# Altium footprint library PcbLib.PcbLib: 37 footprints (part 3 of 3)
Each footprint in its own frame and in the unit in brackets; x right, y up, seen from the top. Pads: shape width x height; smd on the part's side, far side on the other; paste and mask are expansions set on the pad; w line width, h text height; cw(c..) or ccw(c..) is an arc to the next point about the centre after c.
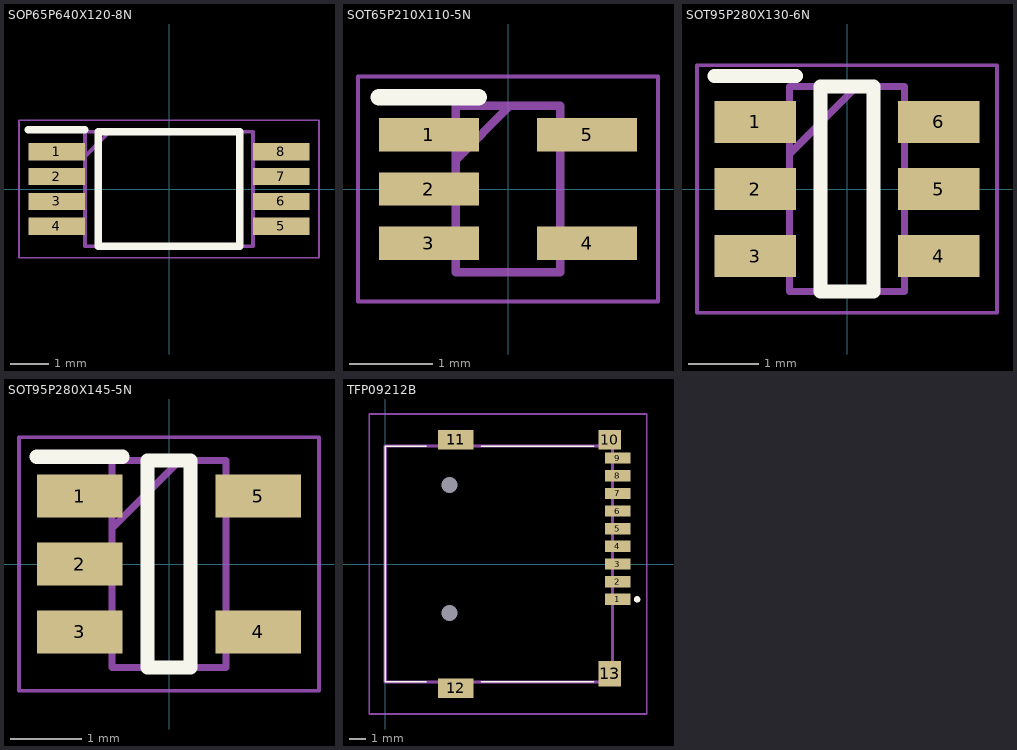
[diagram p2: the footprints below, top view; thin cyan lines are the x and y axes]

## SOP65P640X120-8N [mm]
pads (8):
  rect 1.475x0.45 smd: 1(-2.938,0.975) 2(-2.938,0.325) 3(-2.938,-0.325) 4(-2.938,-0.975) 5(2.938,-0.975) 6(2.938,-0.325) 7(2.938,0.325) 8(2.938,0.975)
Top Overlay:
  lines w0.2: -3.675,1.55 -2.2,1.55 ; -1.85,-1.5 -1.85,1.5 1.85,1.5 1.85,-1.5 -1.85,-1.5
Mechanical 13:
  lines w0.1: -2.2,0.85 -1.55,1.5 ; -2.2,-1.5 -2.2,1.5 2.2,1.5 2.2,-1.5 -2.2,-1.5
Mechanical 15:
  lines w0.05: -3.925,-1.8 -3.925,1.8 3.925,1.8 3.925,-1.8 -3.925,-1.8
3D body "24AA32A-I_ST.stp": height 1.2, standoff 0, extent -3.2,-1.5 3.2,1.5

## SOT65P210X110-5N [mm]
pads (5):
  rect 1.2x0.4 smd: 1(-0.95,0.65) 2(-0.95,0) 3(-0.95,-0.65) 4(0.95,-0.65) 5(0.95,0.65)
Top Overlay:
  lines w0.2: -1.55,1.1 -0.35,1.1
Mechanical 13:
  lines w0.1: -0.625,0.35 0.025,1 ; -0.625,-1 -0.625,1 0.625,1 0.625,-1 -0.625,-1
Mechanical 15:
  lines w0.05: -1.8,-1.35 -1.8,1.35 1.8,1.35 1.8,-1.35 -1.8,-1.35
3D body "ESDALC6V1W5.stp": height 1.1, standoff 0, extent -1.05,-1 1.05,1

## SOT95P280X130-6N [mm]
pads (6):
  rect 1.15x0.6 smd: 1(-1.3,0.95) 2(-1.3,0) 3(-1.3,-0.95) 4(1.3,-0.95) 5(1.3,0) 6(1.3,0.95)
Top Overlay:
  lines w0.2: -1.875,1.6 -0.725,1.6 ; -0.375,-1.45 0.375,-1.45 0.375,1.45 -0.375,1.45 -0.375,-1.45
Mechanical 13:
  lines w0.1: -0.812,0.5 0.138,1.45 ; -0.812,-1.45 0.812,-1.45 0.812,1.45 -0.812,1.45 -0.812,-1.45
Mechanical 15:
  lines w0.05: -2.125,-1.75 2.125,-1.75 2.125,1.75 -2.125,1.75 -2.125,-1.75
3D body "IRLMS6802TRPBF.stp": height 1.3, standoff 0, extent -1.4,-1.45 1.4,1.45

## SOT95P280X145-5N [mm]
pads (5):
  rect 1.2x0.6 smd: 1(-1.25,0.95) 2(-1.25,0) 3(-1.25,-0.95) 4(1.25,-0.95) 5(1.25,0.95)
Top Overlay:
  lines w0.2: -1.85,1.5 -0.65,1.5 ; -0.3,-1.45 0.3,-1.45 0.3,1.45 -0.3,1.45 -0.3,-1.45
Mechanical 13:
  lines w0.1: -0.8,0.5 0.15,1.45 ; -0.8,-1.45 0.8,-1.45 0.8,1.45 -0.8,1.45 -0.8,-1.45
Mechanical 15:
  lines w0.05: -2.1,-1.775 2.1,-1.775 2.1,1.775 -2.1,1.775 -2.1,-1.775
3D body "LP2981IM5X-5.0.stp": height 1.2, standoff 0, extent -1.4,-1.45 1.4,1.45

## TFP09212B [mm]
pads (15):
  rect 1.6x0.7 smd: 1(14.5,-2.2) 2(14.5,-1.1) 3(14.5,0) 4(14.5,1.1) 5(14.5,2.2) 6(14.5,3.3) 7(14.5,4.4) 8(14.5,5.5) 9(14.5,6.6)
  rect 1.4x1.2 smd: 10(14,7.75)
  rect 2.2x1.2 smd: 11(4.4,7.75) 12(4.4,-7.75)
  rect 1.4x1.6 smd: 13(14,-6.85)
  round 0.5 hole 1 unplated: MH1(4,-3.05) MH2(4,4.93)
Top Overlay:
  lines w0.1: 2.54,-7.35 0,-7.35 0,7.35 2.54,7.35 ; 6,-7.35 13,-7.35 ; 6,7.35 13,7.35
  lines w0.2: 15.7,-2.3 cw(c15.7,-2.2) 15.7,-2.1 cw(c15.7,-2.2) 15.7,-2.3
Mechanical 13:
  lines w0.2: 0,-7.35 14.16,-7.35 14.16,7.35 0,7.35 0,-7.35
Mechanical 15:
  lines w0.1: -1,-9.35 16.3,-9.35 16.3,9.35 -1,9.35 -1,-9.35
3D body "TFP09-2-12B.stp": height 1.85, standoff -0.6, extent 0,-8 15.203,8.1